# Altium footprint library PcbLib_Discrete.PcbLib: 118 footprints (part 2 of 8)
Each footprint in its own frame and in the unit in brackets; x right, y up, seen from the top. Pads: shape width x height; smd on the part's side, far side on the other; paste and mask are expansions set on the pad; w line width, h text height; cw(c..) or ccw(c..) is an arc to the next point about the centre after c.
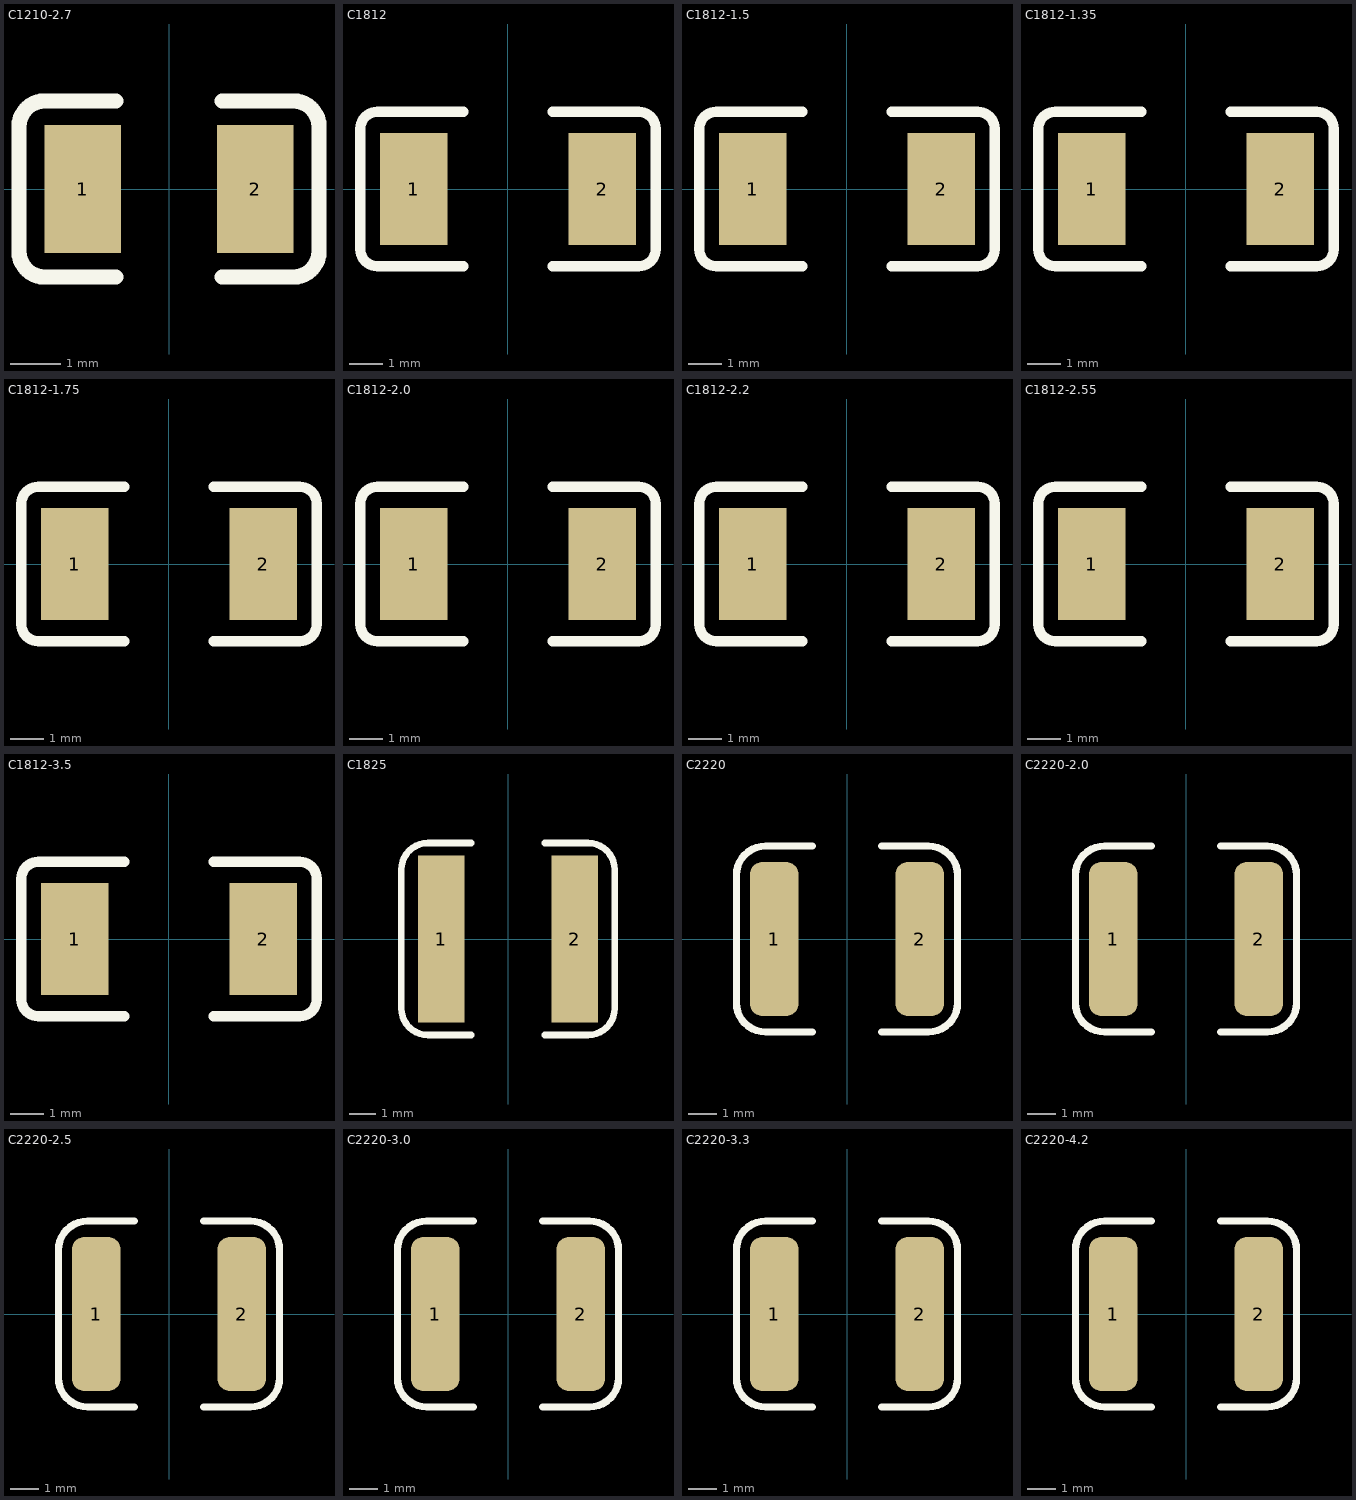
[diagram p1: the footprints below, top view; thin cyan lines are the x and y axes]

## C1210-2.7 [mil] "1.8"
pads (2):
  rect 60x100 smd: 1(-67.5,0) 2(67.5,0)
Top Overlay:
  lines w12: -41.45,-68.95 -97.47,-68.95 cw(c-97.47,-48.95) -117.47,-48.95 -117.47,48.95 cw(c-97.47,48.95) -97.47,68.95 -41.45,68.95 ; 41.45,-68.95 97.47,-68.95 ccw(c97.47,-48.95) 117.47,-48.95 117.47,48.95 ccw(c97.47,48.95) 97.47,68.95 41.45,68.95
3D body "CAP 1210-2.8mm.STEP": height 110.24, standoff 0, extent -62.99,-49.21 62.99,49.21

## C1812 [mm] "1.1"
pads (2):
  rect 2x3.302 smd: 1(-2.786,0) 2(2.786,0)
Top Overlay:
  lines w0.305: -1.321,-2.286 -3.861,-2.286 cw(c-3.861,-1.778) -4.369,-1.778 -4.369,1.778 cw(c-3.861,1.778) -3.861,2.286 -1.321,2.286 ; 1.321,-2.286 3.861,-2.286 ccw(c3.861,-1.778) 4.369,-1.778 4.369,1.778 ccw(c3.861,1.778) 3.861,2.286 1.321,2.286
3D body "CAP 1812-1.1mm.STEP": height 1.1, standoff 0, extent -2.25,-1.6 2.25,1.6

## C1812-1.5 [mm]
pads (2):
  rect 2x3.302 smd: 1(-2.786,0) 2(2.786,0)
Top Overlay:
  lines w0.305: -1.321,-2.286 -3.861,-2.286 cw(c-3.861,-1.778) -4.369,-1.778 -4.369,1.778 cw(c-3.861,1.778) -3.861,2.286 -1.321,2.286 ; 1.321,-2.286 3.861,-2.286 ccw(c3.861,-1.778) 4.369,-1.778 4.369,1.778 ccw(c3.861,1.778) 3.861,2.286 1.321,2.286
3D body "CAP 1812-1.5mm.STEP": height 1.5, standoff 0, extent -2.25,-1.6 2.25,1.6

## C1812-1.35 [mm]
pads (2):
  rect 2x3.302 smd: 1(-2.786,0) 2(2.786,0)
Top Overlay:
  lines w0.305: -1.321,-2.286 -3.861,-2.286 cw(c-3.861,-1.778) -4.369,-1.778 -4.369,1.778 cw(c-3.861,1.778) -3.861,2.286 -1.321,2.286 ; 1.321,-2.286 3.861,-2.286 ccw(c3.861,-1.778) 4.369,-1.778 4.369,1.778 ccw(c3.861,1.778) 3.861,2.286 1.321,2.286
3D body "CAP 1812-1.35mm.STEP": height 1.35, standoff 0, extent -2.25,-1.6 2.25,1.6

## C1812-1.75 [mm]
pads (2):
  rect 2x3.302 smd: 1(-2.786,0) 2(2.786,0)
Top Overlay:
  lines w0.305: -1.321,-2.286 -3.861,-2.286 cw(c-3.861,-1.778) -4.369,-1.778 -4.369,1.778 cw(c-3.861,1.778) -3.861,2.286 -1.321,2.286 ; 1.321,-2.286 3.861,-2.286 ccw(c3.861,-1.778) 4.369,-1.778 4.369,1.778 ccw(c3.861,1.778) 3.861,2.286 1.321,2.286
3D body "CAP 1812-1.75mm.STEP": height 1.75, standoff 0, extent -2.25,-1.6 2.25,1.6

## C1812-2.0 [mm]
pads (2):
  rect 2x3.302 smd: 1(-2.786,0) 2(2.786,0)
Top Overlay:
  lines w0.305: -1.321,-2.286 -3.861,-2.286 cw(c-3.861,-1.778) -4.369,-1.778 -4.369,1.778 cw(c-3.861,1.778) -3.861,2.286 -1.321,2.286 ; 1.321,-2.286 3.861,-2.286 ccw(c3.861,-1.778) 4.369,-1.778 4.369,1.778 ccw(c3.861,1.778) 3.861,2.286 1.321,2.286
3D body "CAP 1812-2.00mm.STEP": height 2, standoff 0, extent -2.25,-1.6 2.25,1.6

## C1812-2.2 [mm]
pads (2):
  rect 2x3.302 smd: 1(-2.786,0) 2(2.786,0)
Top Overlay:
  lines w0.305: -1.321,-2.286 -3.861,-2.286 cw(c-3.861,-1.778) -4.369,-1.778 -4.369,1.778 cw(c-3.861,1.778) -3.861,2.286 -1.321,2.286 ; 1.321,-2.286 3.861,-2.286 ccw(c3.861,-1.778) 4.369,-1.778 4.369,1.778 ccw(c3.861,1.778) 3.861,2.286 1.321,2.286
3D body "CAP 1812-2.20mm.STEP": height 2.2, standoff 0, extent -2.25,-1.6 2.25,1.6

## C1812-2.55 [mm] "1.1"
pads (2):
  rect 2x3.302 smd: 1(-2.786,0) 2(2.786,0)
Top Overlay:
  lines w0.305: -1.321,-2.286 -3.861,-2.286 cw(c-3.861,-1.778) -4.369,-1.778 -4.369,1.778 cw(c-3.861,1.778) -3.861,2.286 -1.321,2.286 ; 1.321,-2.286 3.861,-2.286 ccw(c3.861,-1.778) 4.369,-1.778 4.369,1.778 ccw(c3.861,1.778) 3.861,2.286 1.321,2.286
3D body "CAP 1812-2.55mm.STEP": height 2.55, standoff 0, extent -2.25,-1.6 2.25,1.6

## C1812-3.5 [mm]
pads (2):
  rect 2x3.302 smd: 1(-2.786,0) 2(2.786,0)
Top Overlay:
  lines w0.305: -1.321,-2.286 -3.861,-2.286 cw(c-3.861,-1.778) -4.369,-1.778 -4.369,1.778 cw(c-3.861,1.778) -3.861,2.286 -1.321,2.286 ; 1.321,-2.286 3.861,-2.286 ccw(c3.861,-1.778) 4.369,-1.778 4.369,1.778 ccw(c3.861,1.778) 3.861,2.286 1.321,2.286
3D body "CAP 1812-3.5mm.STEP": height 3.5, standoff 0, extent -2.25,-1.6 2.25,1.6

## C1825 [mil]
pads (2):
  rect 70x250 smd: 1(-100,0) 2(100,0)
Top Overlay:
  lines w10: -55,-144 -120,-144 cw(c-120,-104) -160,-104 -160,104 cw(c-120,104) -120,144 -55,144 ; 55,-144 120,-144 ccw(c120,-104) 160,-104 160,104 ccw(c120,104) 120,144 55,144
3D body "1825C.STEP": height 100.1, standoff 0, extent -110.62,-125.99 110.63,126.01

## C2220 [mm] "1.5"
height 1.5
pads (2):
  rrect50% 1.7x5.4 smd: 1(-2.55,0) 2(2.55,0)
Top Overlay:
  lines w0.254: -1.204,-3.251 -2.855,-3.251 cw(c-2.855,-2.235) -3.871,-2.235 -3.871,2.235 cw(c-2.855,2.235) -2.855,3.251 -1.204,3.251 ; 1.204,-3.251 2.855,-3.251 ccw(c2.855,-2.235) 3.871,-2.235 3.871,2.235 ccw(c2.855,2.235) 2.855,3.251 1.204,3.251
3D body "CAP 2020-1.5mm.STEP": height 1.5, standoff 0, extent -2.85,-2.5 2.85,2.5

## C2220-2.0 [mm]
height 1.5
pads (2):
  rrect50% 1.7x5.4 smd: 1(-2.55,0) 2(2.55,0)
Top Overlay:
  lines w0.254: -1.204,-3.251 -2.855,-3.251 cw(c-2.855,-2.235) -3.871,-2.235 -3.871,2.235 cw(c-2.855,2.235) -2.855,3.251 -1.204,3.251 ; 1.204,-3.251 2.855,-3.251 ccw(c2.855,-2.235) 3.871,-2.235 3.871,2.235 ccw(c2.855,2.235) 2.855,3.251 1.204,3.251
3D body "CAP 2020-2.0mm.STEP": height 2, standoff 0, extent -2.85,-2.5 2.85,2.5

## C2220-2.5 [mm]
height 1.5
pads (2):
  rrect50% 1.7x5.4 smd: 1(-2.55,0) 2(2.55,0)
Top Overlay:
  lines w0.254: -1.204,-3.251 -2.855,-3.251 cw(c-2.855,-2.235) -3.871,-2.235 -3.871,2.235 cw(c-2.855,2.235) -2.855,3.251 -1.204,3.251 ; 1.204,-3.251 2.855,-3.251 ccw(c2.855,-2.235) 3.871,-2.235 3.871,2.235 ccw(c2.855,2.235) 2.855,3.251 1.204,3.251
3D body "CAP 2020-2.0mm.STEP": height 2, standoff 0, extent -2.85,-2.5 2.85,2.5

## C2220-3.0 [mm]
height 1.5
pads (2):
  rrect50% 1.7x5.4 smd: 1(-2.55,0) 2(2.55,0)
Top Overlay:
  lines w0.254: -1.204,-3.251 -2.855,-3.251 cw(c-2.855,-2.235) -3.871,-2.235 -3.871,2.235 cw(c-2.855,2.235) -2.855,3.251 -1.204,3.251 ; 1.204,-3.251 2.855,-3.251 ccw(c2.855,-2.235) 3.871,-2.235 3.871,2.235 ccw(c2.855,2.235) 2.855,3.251 1.204,3.251
3D body "CAP 2020-3.0mm.STEP": height 3, standoff 0, extent -2.85,-2.5 2.85,2.5

## C2220-3.3 [mm]
height 1.5
pads (2):
  rrect50% 1.7x5.4 smd: 1(-2.55,0) 2(2.55,0)
Top Overlay:
  lines w0.254: -1.204,-3.251 -2.855,-3.251 cw(c-2.855,-2.235) -3.871,-2.235 -3.871,2.235 cw(c-2.855,2.235) -2.855,3.251 -1.204,3.251 ; 1.204,-3.251 2.855,-3.251 ccw(c2.855,-2.235) 3.871,-2.235 3.871,2.235 ccw(c2.855,2.235) 2.855,3.251 1.204,3.251
3D body "CAP 2020-3.3mm.STEP": height 3.3, standoff 0, extent -2.85,-2.5 2.85,2.5

## C2220-4.2 [mm]
height 1.5
pads (2):
  rrect50% 1.7x5.4 smd: 1(-2.55,0) 2(2.55,0)
Top Overlay:
  lines w0.254: -1.204,-3.251 -2.855,-3.251 cw(c-2.855,-2.235) -3.871,-2.235 -3.871,2.235 cw(c-2.855,2.235) -2.855,3.251 -1.204,3.251 ; 1.204,-3.251 2.855,-3.251 ccw(c2.855,-2.235) 3.871,-2.235 3.871,2.235 ccw(c2.855,2.235) 2.855,3.251 1.204,3.251
3D body "CAP 2020-4.2mm.STEP": height 4.2, standoff 0, extent -2.85,-2.5 2.85,2.5